# Altium footprint library Connectors.PcbLib: 158 footprints (part 5 of 10)
Each footprint in its own frame and in the unit in brackets; x right, y up, seen from the top. Pads: shape width x height; smd on the part's side, far side on the other; paste and mask are expansions set on the pad; w line width, h text height; cw(c..) or ccw(c..) is an arc to the next point about the centre after c.
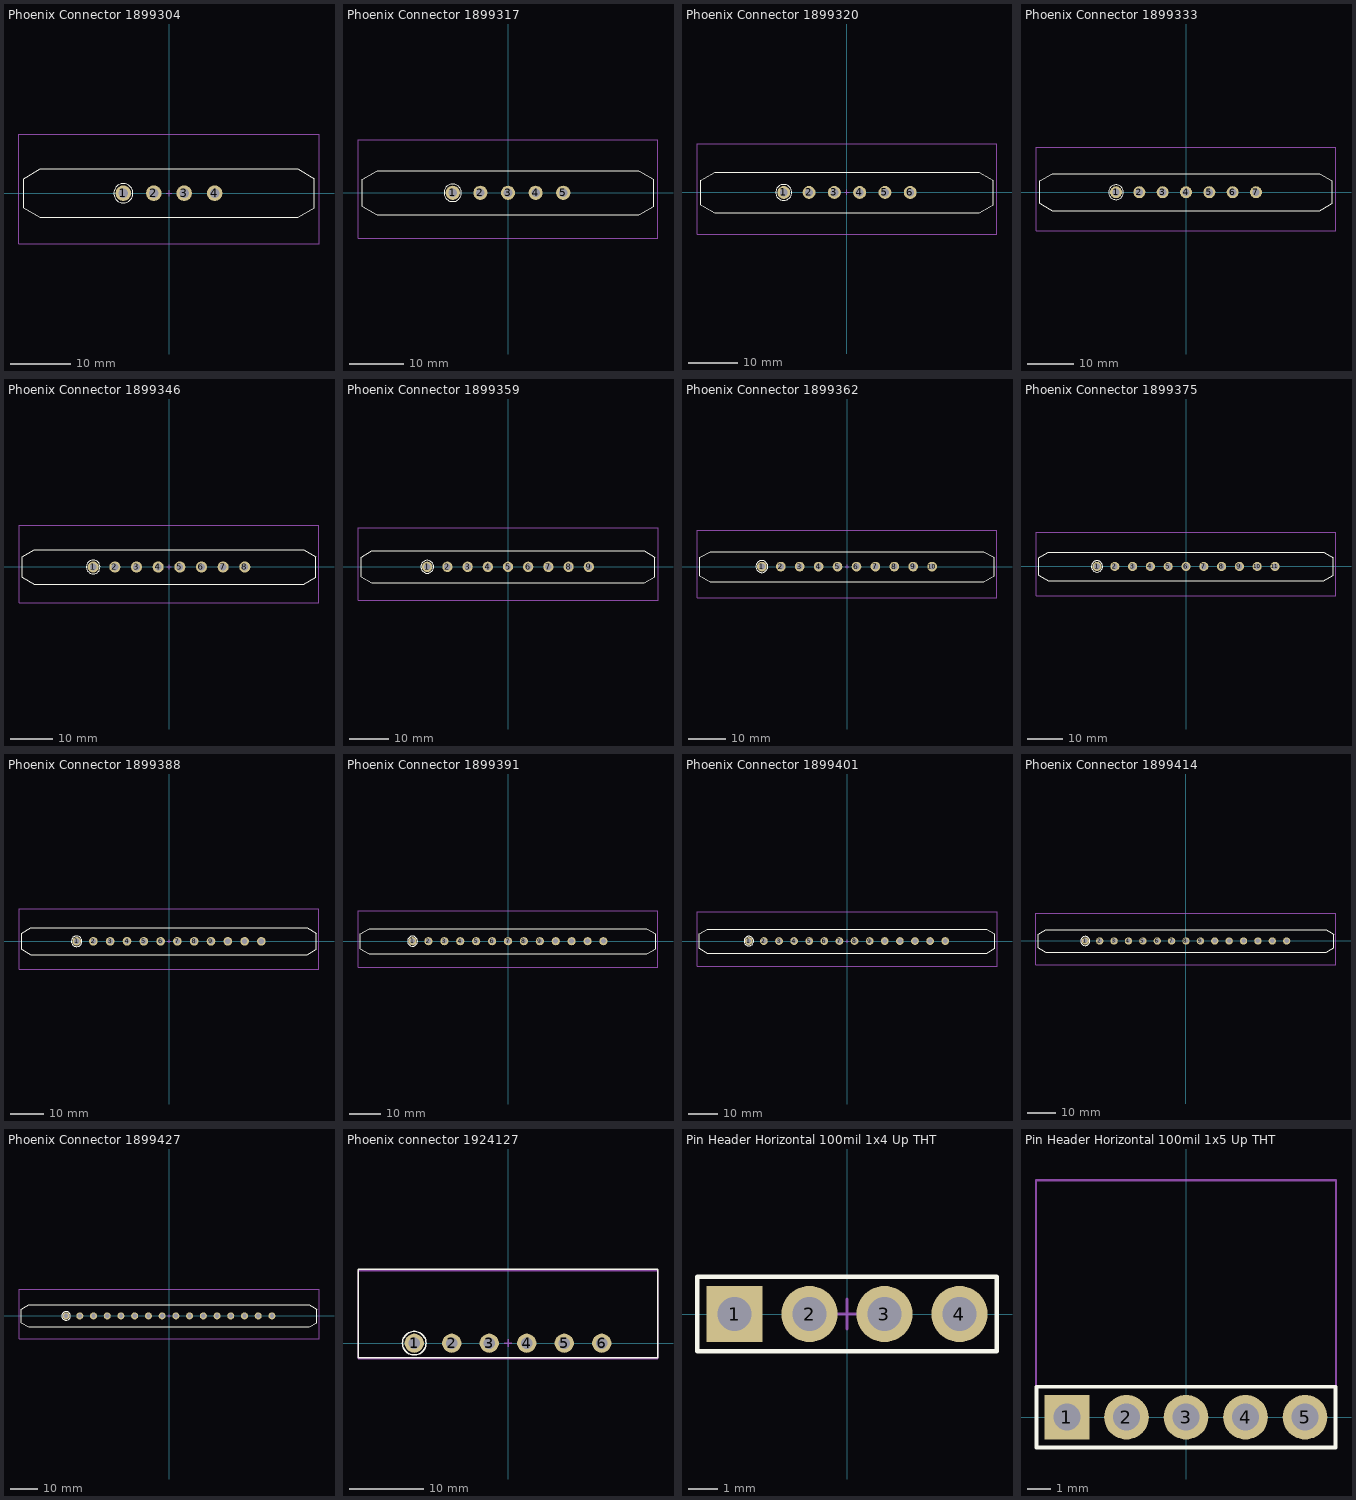
[diagram p4: the footprints below, top view; thin cyan lines are the x and y axes]

## Phoenix Connector 1899304 [mm]
height 12
pads (4):
  round 2.6 hole 1.6: 1(-7.62,0) 2(-2.54,0) 3(2.54,0) 4(7.62,0)
Top Overlay:
  circle w0.2: c-7.62,0 r1.6
  lines w0.2: -24.25,-2.45 -24.25,2.45 -21.52,4.05 21.52,4.05 24.25,2.45 24.25,-2.45 21.52,-4.05 -21.52,-4.05 -24.25,-2.45
Mechanical 15:
  lines w0.2: -0.5,0 0.5,0 ; 0,-0.5 0,0.5 ; -25.04,-8.4 -25.04,9.8 25.04,9.8 25.04,-8.4 -25.04,-8.4
3D body "Phoenix Contact 1899304.stp": height 12.55, standoff -3.35, extent -25.977,-9.337 25.977,10.737

## Phoenix Connector 1899317 [mm]
height 12
pads (5):
  round 2.6 hole 1.6: 1(-10.16,0) 2(-5.08,0) 3(0,0) 4(5.08,0) 5(10.16,0)
Top Overlay:
  circle w0.2: c-10.16,0 r1.6
  lines w0.2: -26.79,-2.45 -26.79,2.45 -24.06,4.05 24.06,4.05 26.79,2.45 26.79,-2.45 24.06,-4.05 -24.06,-4.05 -26.79,-2.45
Mechanical 15:
  lines w0.2: -0.5,0 0.5,0 ; 0,-0.5 0,0.5 ; -27.58,-8.4 -27.58,9.8 27.58,9.8 27.58,-8.4 -27.58,-8.4
3D body "Phoenix Contact 1899317.stp": height 12.55, standoff -3.35, extent -28.517,-9.337 28.517,10.737

## Phoenix Connector 1899320 [mm]
height 12
pads (6):
  round 2.6 hole 1.6: 1(-12.7,0) 2(-7.62,0) 3(-2.54,0) 4(2.54,0) 5(7.62,0) 6(12.7,0)
Top Overlay:
  circle w0.2: c-12.7,0 r1.6
  lines w0.2: -29.33,-2.45 -29.33,2.45 -26.6,4.05 26.6,4.05 29.33,2.45 29.33,-2.45 26.6,-4.05 -26.6,-4.05 -29.33,-2.45
Mechanical 15:
  lines w0.2: -0.5,0 0.5,0 ; 0,-0.5 0,0.5 ; -30.12,-8.4 -30.12,9.8 30.12,9.8 30.12,-8.4 -30.12,-8.4
3D body "Phoenix Contact 1899320.stp": height 12.55, standoff -3.35, extent -31.057,-9.335 31.057,10.739

## Phoenix Connector 1899333 [mm]
height 12
pads (7):
  round 2.6 hole 1.6: 1(-15.24,0) 2(-10.16,0) 3(-5.08,0) 4(0,0) 5(5.08,0) 6(10.16,0) 7(15.24,0)
Top Overlay:
  circle w0.2: c-15.24,0 r1.6
  lines w0.2: -31.87,-2.45 -29.14,-4.05 29.14,-4.05 31.87,-2.45 31.87,2.45 29.14,4.05 -29.14,4.05 -31.87,2.45 -31.87,-2.45
Mechanical 15:
  lines w0.2: -0.5,0 0.5,0 ; 0,-0.5 0,0.5 ; -32.66,-8.4 32.66,-8.4 32.66,9.8 -32.66,9.8 -32.66,-8.4
3D body "Phoenix Contact 1899333.stp": height 12.55, standoff -3.35, extent -33.597,-9.337 33.597,10.737

## Phoenix Connector 1899346 [mm]
height 12
pads (8):
  round 2.6 hole 1.6: 1(-17.78,0) 2(-12.7,0) 3(-7.62,0) 4(-2.54,0) 5(2.54,0) 6(7.62,0) 7(12.7,0) 8(17.78,0)
Top Overlay:
  circle w0.2: c-17.78,0 r1.6
  lines w0.2: -34.41,-2.45 -31.68,-4.05 31.68,-4.05 34.41,-2.45 34.41,2.45 31.68,4.05 -31.68,4.05 -34.41,2.45 -34.41,-2.45
Mechanical 15:
  lines w0.2: -0.5,0 0.5,0 ; 0,-0.5 0,0.5 ; -35.2,-8.4 35.2,-8.4 35.2,9.8 -35.2,9.8 -35.2,-8.4
3D body "Phoenix Contact 1899346.stp": height 12.55, standoff -3.35, extent -36.137,-9.337 36.137,10.737

## Phoenix Connector 1899359 [mm]
height 12
pads (9):
  round 2.6 hole 1.6: 1(-20.32,0) 2(-15.24,0) 3(-10.16,0) 4(-5.08,0) 5(0,0) 6(5.08,0) 7(10.16,0) 8(15.24,0) 9(20.32,0)
Top Overlay:
  circle w0.2: c-20.32,0 r1.6
  lines w0.2: -36.95,-2.45 -34.22,-4.05 34.22,-4.05 36.95,-2.45 36.95,2.45 34.22,4.05 -34.22,4.05 -36.95,2.45 -36.95,-2.45
Mechanical 15:
  lines w0.2: -0.5,0 0.5,0 ; 0,-0.5 0,0.5 ; -37.74,-8.4 37.74,-8.4 37.74,9.8 -37.74,9.8 -37.74,-8.4
3D body "Phoenix Contact 1899359.stp": height 12.55, standoff -3.35, extent -38.677,-9.337 38.677,10.737

## Phoenix Connector 1899362 [mm]
height 12
pads (10):
  round 2.6 hole 1.6: 1(-22.86,0) 2(-17.78,0) 3(-12.7,0) 4(-7.62,0) 5(-2.54,0) 6(2.54,0) 7(7.62,0) 8(12.7,0) 9(17.78,0) 10(22.86,0)
Top Overlay:
  circle w0.2: c-22.86,0 r1.6
  lines w0.2: -39.49,-2.45 -39.49,2.45 -36.76,4.05 36.76,4.05 39.49,2.45 39.49,-2.45 36.76,-4.05 -36.76,-4.05 -39.49,-2.45
Mechanical 15:
  lines w0.2: -0.5,0 0.5,0 ; 0,-0.5 0,0.5 ; -40.28,-8.4 -40.28,9.8 40.28,9.8 40.28,-8.4 -40.28,-8.4
3D body "Phoenix Contact 1899362.stp": height 12.55, standoff -3.35, extent -41.217,-9.337 41.217,10.737

## Phoenix Connector 1899375 [mm]
height 12
pads (11):
  round 2.6 hole 1.6: 1(-25.4,0) 2(-20.32,0) 3(-15.24,0) 4(-10.16,0) 5(-5.08,0) 6(0,0) 7(5.08,0) 8(10.16,0) 9(15.24,0) 10(20.32,0) 11(25.4,0)
Top Overlay:
  circle w0.2: c-25.4,0 r1.6
  lines w0.2: -42.03,-2.45 -42.03,2.45 -39.3,4.05 39.3,4.05 42.03,2.45 42.03,-2.45 39.3,-4.05 -39.3,-4.05 -42.03,-2.45
Mechanical 15:
  lines w0.2: -0.5,0 0.5,0 ; 0,-0.5 0,0.5 ; -42.82,-8.4 -42.82,9.8 42.82,9.8 42.82,-8.4 -42.82,-8.4
3D body "Phoenix Contact 1899375.stp": height 12.55, standoff -3.35, extent -43.757,-9.337 43.757,10.737

## Phoenix Connector 1899388 [mm]
height 12
pads (12):
  round 2.6 hole 1.6: 1(-27.94,0) 2(-22.86,0) 3(-17.78,0) 4(-12.7,0) 5(-7.62,0) 6(-2.54,0) 7(2.54,0) 8(7.62,0) 9(12.7,0) 10(17.78,0) 11(22.86,0) 12(27.94,0)
Top Overlay:
  circle w0.2: c-27.94,0 r1.6
  lines w0.2: -44.57,-2.45 -44.57,2.45 -41.84,4.05 41.84,4.05 44.57,2.45 44.57,-2.45 41.84,-4.05 -41.84,-4.05 -44.57,-2.45
Mechanical 15:
  lines w0.2: -0.5,0 0.5,0 ; 0,-0.5 0,0.5 ; -45.36,-8.4 -45.36,9.8 45.36,9.8 45.36,-8.4 -45.36,-8.4
3D body "Phoenix Contact 1899388.stp": height 12.55, standoff -3.35, extent -46.297,-9.337 46.297,10.737

## Phoenix Connector 1899391 [mm]
height 12
pads (13):
  round 2.6 hole 1.6: 1(-30.48,0) 2(-25.4,0) 3(-20.32,0) 4(-15.24,0) 5(-10.16,0) 6(-5.08,0) 7(0,0) 8(5.08,0) 9(10.16,0) 10(15.24,0) 11(20.32,0) 12(25.4,0) 13(30.48,0)
Top Overlay:
  circle w0.2: c-30.48,0 r1.6
  lines w0.2: -47.11,-2.45 -47.11,2.45 -44.38,4.05 44.38,4.05 47.11,2.45 47.11,-2.45 44.38,-4.05 -44.38,-4.05 -47.11,-2.45
Mechanical 15:
  lines w0.2: -0.5,0 0.5,0 ; 0,-0.5 0,0.5 ; -47.9,-8.4 -47.9,9.8 47.9,9.8 47.9,-8.4 -47.9,-8.4
3D body "Phoenix Contact 1899391.stp": height 12.55, standoff -3.35, extent -48.837,-9.337 48.837,10.737

## Phoenix Connector 1899401 [mm]
height 12
pads (14):
  round 2.6 hole 1.6: 1(-33.02,0) 2(-27.94,0) 3(-22.86,0) 4(-17.78,0) 5(-12.7,0) 6(-7.62,0) 7(-2.54,0) 8(2.54,0) 9(7.62,0) 10(12.7,0) 11(17.78,0) 12(22.86,0) 13(27.94,0) 14(33.02,0)
Top Overlay:
  circle w0.2: c-33.02,0 r1.6
  lines w0.2: -49.65,-2.45 -49.65,2.45 -46.92,4.05 46.92,4.05 49.65,2.45 49.65,-2.45 46.92,-4.05 -46.92,-4.05 -49.65,-2.45
Mechanical 15:
  lines w0.2: -0.5,0 0.5,0 ; 0,-0.5 0,0.5 ; -50.44,-8.4 -50.44,9.8 50.44,9.8 50.44,-8.4 -50.44,-8.4
3D body "Phoenix Contact 1899401.stp": height 12.55, standoff -3.35, extent -51.377,-9.337 51.377,10.737

## Phoenix Connector 1899414 [mm]
height 12
pads (15):
  round 2.6 hole 1.6: 1(-35.56,0) 2(-30.48,0) 3(-25.4,0) 4(-20.32,0) 5(-15.24,0) 6(-10.16,0) 7(-5.08,0) 8(0,0) 9(5.08,0) 10(10.16,0) 11(15.24,0) 12(20.32,0) 13(25.4,0) 14(30.48,0) 15(35.56,0)
Top Overlay:
  circle w0.2: c-35.56,0 r1.6
  lines w0.2: -52.19,-2.45 -49.46,-4.05 49.46,-4.05 52.19,-2.45 52.19,2.45 49.46,4.05 -49.46,4.05 -52.19,2.45 -52.19,-2.45
Mechanical 15:
  lines w0.2: -0.5,0 0.5,0 ; 0,-0.5 0,0.5 ; -52.98,-8.4 52.98,-8.4 52.98,9.8 -52.98,9.8 -52.98,-8.4
3D body "Phoenix Contact 1899414.stp": height 12.55, standoff -3.35, extent -53.917,-9.337 53.917,10.737

## Phoenix Connector 1899427 [mm]
height 12
pads (16):
  round 2.6 hole 1.6: 1(-38.1,0) 2(-33.02,0) 3(-27.94,0) 4(-22.86,0) 5(-17.78,0) 6(-12.7,0) 7(-7.62,0) 8(-2.54,0) 9(2.54,0) 10(7.62,0) 11(12.7,0) 12(17.78,0) 13(22.86,0) 14(27.94,0) 15(33.02,0) 16(38.1,0)
Top Overlay:
  circle w0.2: c-38.1,0 r1.6
  lines w0.2: -54.73,-2.45 -52,-4.05 52,-4.05 54.73,-2.45 54.73,2.45 52,4.05 -52,4.05 -54.73,2.45 -54.73,-2.45
Mechanical 15:
  lines w0.2: -0.5,0 0.5,0 ; 0,-0.5 0,0.5 ; -55.52,-8.4 55.52,-8.4 55.52,9.8 -55.52,9.8 -55.52,-8.4
3D body "Phoenix Contact 1899427.stp": height 12.55, standoff -3.35, extent -56.457,-9.337 56.457,10.737

## Phoenix connector 1924127 [mm]
height 8.6
pads (6):
  round 2.6 hole 1.6: 1(-12.7,0) 2(-7.62,0) 3(-2.54,0) 4(2.54,0) 5(7.62,0) 6(12.7,0)
Top Overlay:
  circle w0.2: c-12.7,0 r1.6
  lines w0.2: -20.32,-2 -20.32,10 20.32,10 20.32,-2 -20.32,-2
Mechanical 15:
  lines w0.2: -0.5,0 0.5,0 ; 0,-0.5 0,0.5 ; -20.32,-2.1 -20.32,9.8 20.32,9.8 20.32,-2.1 -20.32,-2.1
3D body "Phoenix Contact 1924127.stp": height 9.1, standoff -3, extent -20.333,-2.007 20.307,9.996

## Pin Header Horizontal 100mil 1x4 Up THT [mil]
pads (4):
  rect 75x75 hole 45: 1(-150,0)
  round 75 hole 45: 2(-50,0) 3(50,0) 4(150,0)
Top Overlay:
  lines w6: -200,-50 -200,50 200,50 200,-50 -200,-50
Mechanical 15:
  lines w4: -20,0 20,0 ; 0,-20 0,20
3D body "pin_header_horizontal_male_100mil_1x4_THT.stp": height 101, standoff -117.11, extent -200,-11.65 200,396.22

## Pin Header Horizontal 100mil 1x5 Up THT [mil]
pads (5):
  rect 75x75 hole 45: 1(-200,0)
  round 75 hole 45: 2(-100,0) 3(0,0) 4(100,0) 5(200,0)
Top Overlay:
  lines w6.3: -250.98,-51.18 -250.98,51.18 250.98,51.18 250.98,-51.18 -250.98,-51.18
Mechanical 15:
  lines w3.94: -19.68,0 19.68,0 ; 0,-19.68 0,19.68 ; -251.97,-51.18 251.97,-51.18 251.97,397.64 -251.97,397.64 -251.97,-51.18
3D body "pin_header_horizontal_male_100mil_1x5_THT.stp": height 101, standoff -117.11, extent -250,-11.65 250,396.22